# Altium footprint library HARTING THD.PcbLib: 113 footprints (part 5 of 11)
Each footprint in its own frame and in the unit in brackets; x right, y up, seen from the top. Pads: shape width x height; smd on the part's side, far side on the other; paste and mask are expansions set on the pad; w line width, h text height; cw(c..) or ccw(c..) is an arc to the next point about the centre after c.
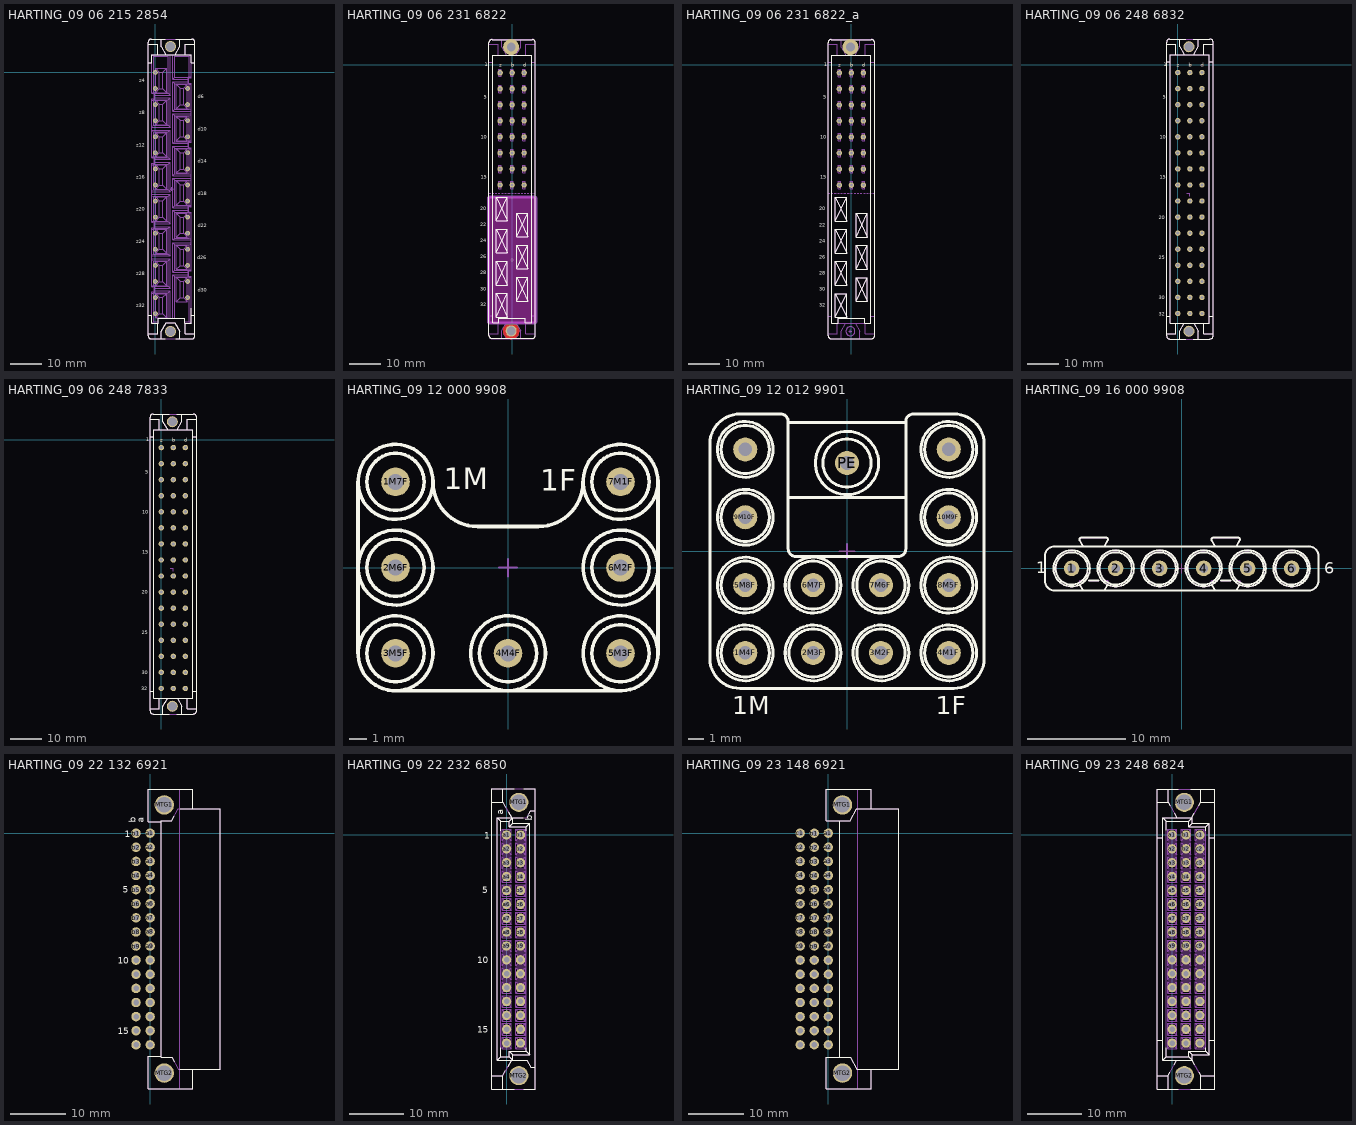
[diagram p4: the footprints below, top view; thin cyan lines are the x and y axes]

## HARTING_09 06 215 2854 [mm] "DIN 41612, Type H, 15 Poles, 2Pins/Pole, Rows z+d, Performance level 1, Low Profile Straight Female Connector, Lead 4.0 mm, Pitch 5.08mm, Pressfit"
height 10.1
pads (32):
  round 1.5 hole 1: d5(10.16,-5.08) d7(10.16,-10.16) d9(10.16,-15.24) d11(10.16,-20.32) d13(10.16,-25.4) d15(10.16,-30.48) d17(10.16,-35.56) d19(10.16,-40.64) d21(10.16,-45.72) d23(10.16,-50.8) d25(10.16,-55.88) d27(10.16,-60.96) d29(10.16,-66.04) d31(10.16,-71.12) z3(0,0) z5(0,-5.08) z7(0,-10.16) z9(0,-15.24) z11(0,-20.32) z13(0,-25.4) z15(0,-30.48) z17(0,-35.56) z19(0,-40.64) z21(0,-45.72) z23(0,-50.8) z25(0,-55.88) z27(0,-60.96) z29(0,-66.04) z31(0,-71.12) z33(0,-76.2)
  round 3.5 / inner round 3.5 / far side round 5.1 hole 2.8: MTG1(4.78,8.17) MTG2(4.78,-81.83)
Top Overlay:
  lines w0.2: 0.705,-79.24 0.705,-82.58 -2.27,-82.58 ; 0.705,5.58 0.705,8.92 -2.27,8.92 ; 3.175,-84.205 1.805,-84.205 ; 3.175,10.545 1.805,10.545 ; 3.3,5.58 1.805,8.17 1.805,10.545 ; 6.26,5.58 7.755,8.17 7.755,10.545 ; 6.385,-84.205 7.755,-84.205 ; 6.385,10.545 7.755,10.545 ; 9.455,-79.24 9.455,-82.58 12.43,-82.58 ; 9.455,5.58 9.455,8.92 12.43,8.92 ; 11.265,-76.78 12.43,-76.78 ; 11.265,-74.54 11.265,-79.24 9.305,-79.24 9.305,-78.69 9.305,-77.67 0.855,-77.67 0.855,-78.69 0.855,-79.24 -1.105,-79.24 -1.105,-76.78 -2.27,-76.78 ; -2.27,-82.58 -2.27,-83.205 ccw(c-1.27,-83.205) -1.27,-84.205 1.805,-84.205 ; -2.27,-82.58 -2.27,-76.78 ; -2.27,-76.78 -2.27,3.12 ; -2.27,3.12 -1.105,3.12 -1.105,5.58 11.265,5.58 11.265,3.12 12.43,3.12 ; -2.27,3.12 -2.27,8.92 ; -2.27,8.92 -2.27,9.545 cw(c-1.27,9.545) -1.27,10.545 1.805,10.545 ; 1.805,-84.205 1.805,-81.83 3.378,-79.105 6.182,-79.105 7.755,-81.83 7.755,-84.205 ; 7.755,-84.205 11.43,-84.205 ccw(c11.43,-83.205) 12.43,-83.205 12.43,-82.58 ; 7.755,10.545 11.43,10.545 cw(c11.43,9.545) 12.43,9.545 12.43,8.92 ; 12.43,-82.58 12.43,-76.78 ; 12.43,-76.78 12.43,3.12 ; 12.43,3.12 12.43,8.92
  text "z32" at -6.02,-74.235 h1.2
  text "z28" at -6.02,-64.075 h1.2
  text "z24" at -6.02,-53.915 h1.2
  text "z20" at -6.02,-43.755 h1.2
  text "z16" at -6.02,-33.595 h1.2
  text "z12" at -6.02,-23.435 h1.2
  text "z8" at -5.125,-13.225 h1.2
  text "z4" at -5.125,-3.065 h1.2
  text "d6" at 13.395,-8.187 h1.2
  text "d10" at 13.4,-18.417 h1.2
  text "d14" at 13.4,-28.577 h1.2
  text "d18" at 13.4,-38.737 h1.2
  text "d22" at 13.4,-48.897 h1.2
  text "d26" at 13.275,-59.057 h1.2
  text "d30" at 13.4,-69.217 h1.2
Mechanical 8:
  lines w0.1: -0.5,-76.2 0,-76.2 ; -0.5,-71.12 0,-71.12 ; -0.5,-66.04 0,-66.04 ; -0.5,-60.96 0,-60.96 ; -0.5,-55.88 0,-55.88 ; -0.5,-50.8 0,-50.8 ; -0.5,-45.72 0,-45.72 ; -0.5,-40.64 0,-40.64 ; -0.5,-35.56 0,-35.56 ; -0.5,-30.48 0,-30.48 ; -0.5,-25.4 0,-25.4 ; -0.5,-20.32 0,-20.32 ; -0.5,-15.24 0,-15.24 ; -0.5,-10.16 0,-10.16 ; -0.5,-5.08 0,-5.08 ; -0.5,0 0,0 ; 0,-76.7 0,-76.2 ; 0,-75.7 0,-76.2 ; 0,-71.62 0,-71.12 ; 0,-70.62 0,-71.12 ; 0,-66.54 0,-66.04 ; 0,-65.54 0,-66.04 ; 0,-61.46 0,-60.96 ; 0,-60.46 0,-60.96 ; 0,-56.38 0,-55.88 ; 0,-55.38 0,-55.88 ; 0,-51.3 0,-50.8 ; 0,-50.3 0,-50.8 ; 0,-46.22 0,-45.72 ; 0,-45.22 0,-45.72 ; 0,-41.14 0,-40.64 ; 0,-40.14 0,-40.64 ; 0,-36.06 0,-35.56 ; 0,-35.06 0,-35.56 ; 0,-30.98 0,-30.48 ; 0,-29.98 0,-30.48 ; 0,-25.9 0,-25.4 ; 0,-24.9 0,-25.4 ; 0,-20.82 0,-20.32 ; 0,-19.82 0,-20.32 ; 0,-15.74 0,-15.24 ; 0,-14.74 0,-15.24 ; 0,-10.66 0,-10.16 ; 0,-9.66 0,-10.16 ; 0,-5.58 0,-5.08 ; 0,-4.58 0,-5.08 ; 0,-0.5 0,0 ; 0,0.5 0,0 ; 0.5,-76.2 0,-76.2 ; 0.5,-71.12 0,-71.12 ; 0.5,-66.04 0,-66.04 ; 0.5,-60.96 0,-60.96 ; 0.5,-55.88 0,-55.88 ; 0.5,-50.8 0,-50.8 ; 0.5,-45.72 0,-45.72 ; 0.5,-40.64 0,-40.64 ; 0.5,-35.56 0,-35.56 ; 0.5,-30.48 0,-30.48 ; 0.5,-25.4 0,-25.4 ; 0.5,-20.32 0,-20.32 ; 0.5,-15.24 0,-15.24 ; 0.5,-10.16 0,-10.16 ; 0.5,-5.08 0,-5.08 ; 0.5,0 0,0 ; 4.28,-81.83 4.78,-81.83 ; 4.28,8.17 4.78,8.17 ; 4.78,-82.33 4.78,-81.83 ; 4.78,-81.33 4.78,-81.83 ; 4.78,7.67 4.78,8.17 ; 4.78,8.67 4.78,8.17 ; 5.28,-81.83 4.78,-81.83 ; 5.28,8.17 4.78,8.17 ; 9.66,-71.12 10.16,-71.12 ; 9.66,-66.04 10.16,-66.04 ; 9.66,-60.96 10.16,-60.96 ; 9.66,-55.88 10.16,-55.88 ; 9.66,-50.8 10.16,-50.8 ; 9.66,-45.72 10.16,-45.72 ; 9.66,-40.64 10.16,-40.64 ; 9.66,-35.56 10.16,-35.56 ; 9.66,-30.48 10.16,-30.48 ; 9.66,-25.4 10.16,-25.4 ; 9.66,-20.32 10.16,-20.32 ; 9.66,-15.24 10.16,-15.24 ; 9.66,-10.16 10.16,-10.16 ; 9.66,-5.08 10.16,-5.08 ; 10.16,-71.62 10.16,-71.12 ; 10.16,-70.62 10.16,-71.12 ; 10.16,-66.54 10.16,-66.04 ; 10.16,-65.54 10.16,-66.04 ; 10.16,-61.46 10.16,-60.96 ; 10.16,-60.46 10.16,-60.96 ; 10.16,-56.38 10.16,-55.88 ; 10.16,-55.38 10.16,-55.88 ; 10.16,-51.3 10.16,-50.8 ; 10.16,-50.3 10.16,-50.8 ; 10.16,-46.22 10.16,-45.72 ; 10.16,-45.22 10.16,-45.72 ; 10.16,-41.14 10.16,-40.64 ; 10.16,-40.14 10.16,-40.64 ; 10.16,-36.06 10.16,-35.56 ; 10.16,-35.06 10.16,-35.56 ; 10.16,-30.98 10.16,-30.48 ; 10.16,-29.98 10.16,-30.48 ; 10.16,-25.9 10.16,-25.4 ; 10.16,-24.9 10.16,-25.4 ; 10.16,-20.82 10.16,-20.32 ; 10.16,-19.82 10.16,-20.32 ; 10.16,-15.74 10.16,-15.24 ; 10.16,-14.74 10.16,-15.24 ; 10.16,-10.66 10.16,-10.16 ; 10.16,-9.66 10.16,-10.16 ; 10.16,-5.58 10.16,-5.08 ; 10.16,-4.58 10.16,-5.08 ; 10.66,-71.12 10.16,-71.12 ; 10.66,-66.04 10.16,-66.04 ; 10.66,-60.96 10.16,-60.96 ; 10.66,-55.88 10.16,-55.88 ; 10.66,-50.8 10.16,-50.8 ; 10.66,-45.72 10.16,-45.72 ; 10.66,-40.64 10.16,-40.64 ; 10.66,-35.56 10.16,-35.56 ; 10.66,-30.48 10.16,-30.48 ; 10.66,-25.4 10.16,-25.4 ; 10.66,-20.32 10.16,-20.32 ; 10.66,-15.24 10.16,-15.24 ; 10.66,-10.16 10.16,-10.16 ; 10.66,-5.08 10.16,-5.08 ; 5.08,-36.83 5.08,-36.33 5.08,-36.83 ; 5.08,-36.83 5.58,-36.83 5.08,-36.83 ; 5.08,-36.83 5.08,-37.33 5.08,-36.83 ; 5.08,-36.83 4.58,-36.83 5.08,-36.83
Mechanical 14:
  drawing of 585 lines, arcs and shapes, not listed
  text "z4" at -5.125,-3.065 h1.2
  text "z8" at -5.125,-13.225 h1.2
  text "z12" at -6.02,-23.435 h1.2
  text "z16" at -6.02,-33.595 h1.2
  text "z20" at -6.02,-43.755 h1.2
  text "z24" at -6.02,-53.915 h1.2
  text "z28" at -6.02,-64.075 h1.2
  text "z32" at -6.02,-74.235 h1.2
  text "z4" at -5.125,-3.065 h1.2
  text "z8" at -5.125,-13.225 h1.2
  text "z12" at -6.02,-23.435 h1.2
  text "z16" at -6.02,-33.595 h1.2
  text "z20" at -6.02,-43.755 h1.2
  text "z24" at -6.02,-53.915 h1.2
  text "z28" at -6.02,-64.075 h1.2
  text "z32" at -6.02,-74.235 h1.2
  text "z32" at -6.02,-74.235 h1.2
  text "z28" at -6.02,-64.075 h1.2
  text "z24" at -6.02,-53.915 h1.2
  text "z20" at -6.02,-43.755 h1.2
  text "z16" at -6.02,-33.595 h1.2
  text "z12" at -6.02,-23.435 h1.2
  text "z8" at -5.125,-13.225 h1.2
  text "z4" at -5.125,-3.065 h1.2
  text "d6" at 13.395,-8.187 h1.2
  text "d10" at 13.4,-18.417 h1.2
  text "d14" at 13.4,-28.577 h1.2
  text "d18" at 13.4,-38.737 h1.2
  text "d22" at 13.4,-48.897 h1.2
  text "d26" at 13.275,-59.057 h1.2
  text "d30" at 13.4,-69.217 h1.2
  text "d30" at 13.4,-69.217 h1.2
  text "d26" at 13.275,-59.057 h1.2
  text "d22" at 13.4,-48.897 h1.2
  text "d18" at 13.4,-38.737 h1.2
  text "d14" at 13.4,-28.577 h1.2
  text "d10" at 13.4,-18.417 h1.2
  text "d6" at 13.395,-8.187 h1.2
  text "d30" at 13.4,-69.217 h1.2
  text "d26" at 13.275,-59.057 h1.2
  text "d22" at 13.4,-48.897 h1.2
  text "d18" at 13.4,-38.737 h1.2
  text "d14" at 13.4,-28.577 h1.2
  text "d10" at 13.4,-18.417 h1.2
  text "d6" at 13.395,-8.187 h1.2
Drill Drawing:
  lines w0.1: -2.5,-55.38 -2.5,-78.24 12.74,-78.24 12.74,5.58 -2.5,5.58 -2.5,-17.28
  text "PRESS-FIT TECHNOLOGY diam. 1mm +0.1 -0" at -2.4,-52.54 h1
3D body "HARTING_09 06 215 2854.stp": height 10.1, standoff -3.6, extent -2.27,-84.205 12.43,10.545

## HARTING_09 06 231 6822 [mm] "DIN 41612, Type MH, 24+ 7 Contacts, Rows z+b+d, Performance level 2, Straight Female Connector"
height 20.53
pads (26):
  round 1.7 hole 1: b2(0,-2.54) b4(0,-7.62) b6(0,-12.7) b8(0,-17.78) b10(0,-22.86) b12(0,-27.94) b14(0,-33.02) b16(0,-38.1) d2(3.81,-2.54) d4(3.81,-7.62) d6(3.81,-12.7) d8(3.81,-17.78) d10(3.81,-22.86) d12(3.81,-27.94) d14(3.81,-33.02) d16(3.81,-38.1) z2(-3.81,-2.54) z4(-3.81,-7.62) z6(-3.81,-12.7) z8(-3.81,-17.78) z10(-3.81,-22.86) z12(-3.81,-27.94) z14(-3.81,-33.02) z16(-3.81,-38.1)
  round 5.1 hole 2.8: MTG1(-0.3,5.63)
  round 3.5 hole 2.8: MTG2(-0.3,-84.37)
Top Layer:
  region: -1.882,-82.37 -2.059,-82.51 -2.358,-82.848 -2.594,-83.233 -2.758,-83.654 -2.845,-84.097 -2.854,-84.548 -2.783,-84.994 -2.634,-85.421 -2.414,-85.814 -2.127,-86.163 -1.783,-86.456 -1.394,-86.685 -0.97,-86.841 -0.526,-86.92 -0.074,-86.92 0.37,-86.841 0.794,-86.685 1.183,-86.456 1.527,-86.163 1.814,-85.814 2.034,-85.421 2.183,-84.994 2.254,-84.548 2.245,-84.097 2.158,-83.654 1.994,-83.233 1.758,-82.848 1.459,-82.51 1.282,-82.37
Bottom Layer:
  region: -1.882,-82.37 -2.059,-82.51 -2.358,-82.848 -2.594,-83.233 -2.758,-83.654 -2.845,-84.097 -2.854,-84.548 -2.783,-84.994 -2.634,-85.421 -2.414,-85.814 -2.127,-86.163 -1.783,-86.456 -1.394,-86.685 -0.97,-86.841 -0.526,-86.92 -0.074,-86.92 0.37,-86.841 0.794,-86.685 1.183,-86.456 1.527,-86.163 1.814,-85.814 2.034,-85.421 2.183,-84.994 2.254,-84.548 2.245,-84.097 2.158,-83.654 1.994,-83.233 1.758,-82.848 1.459,-82.51 1.282,-82.37
Top Overlay:
  lines w0.2: -5.025,-79.965 -1.475,-79.965 ; -5.025,-79.965 -5.025,-72.435 ; -5.025,-79.965 -1.475,-72.435 ; -5.025,-72.435 -1.475,-72.435 ; -5.025,-72.435 -1.475,-79.965 ; -5.025,-69.805 -1.475,-69.805 ; -5.025,-69.805 -5.025,-62.275 ; -5.025,-69.805 -1.475,-62.275 ; -5.025,-62.275 -1.475,-62.275 ; -5.025,-62.275 -1.475,-69.805 ; -5.025,-59.645 -1.475,-59.645 ; -5.025,-59.645 -5.025,-52.115 ; -5.025,-59.645 -1.475,-52.115 ; -5.025,-52.115 -1.475,-52.115 ; -5.025,-52.115 -1.475,-59.645 ; -5.025,-49.485 -1.475,-49.485 ; -5.025,-49.485 -5.025,-41.955 ; -5.025,-49.485 -1.475,-41.955 ; -5.025,-41.955 -1.475,-41.955 ; -5.025,-41.955 -1.475,-49.485 ; -1.475,-79.965 -1.475,-72.435 ; -1.475,-69.805 -1.475,-62.275 ; -1.475,-59.645 -1.475,-52.115 ; -1.475,-49.485 -1.475,-41.955 ; 1.475,-74.885 1.475,-67.355 ; 1.475,-74.885 5.025,-67.355 ; 1.475,-74.885 5.025,-74.885 ; 1.475,-67.355 5.025,-74.885 ; 1.475,-67.355 5.025,-67.355 ; 1.475,-64.725 5.025,-64.725 ; 1.475,-64.725 1.475,-57.195 ; 1.475,-64.725 5.025,-57.195 ; 1.475,-57.195 5.025,-57.195 ; 1.475,-57.195 5.025,-64.725 ; 1.475,-54.565 5.025,-54.565 ; 1.475,-54.565 1.475,-47.035 ; 1.475,-54.565 5.025,-47.035 ; 1.475,-47.035 5.025,-47.035 ; 1.475,-47.035 5.025,-54.565 ; 5.025,-74.885 5.025,-67.355 ; 5.025,-64.725 5.025,-57.195 ; 5.025,-54.565 5.025,-47.035 ; -7.35,-85.745 ccw(c-6.35,-85.745) -6.35,-86.745 6.35,-86.745 ccw(c6.35,-85.745) 7.35,-85.745 7.35,7.005 ccw(c6.35,7.005) 6.35,8.005 -6.35,8.005 ccw(c-6.35,7.005) -7.35,7.005 -7.35,-85.745 ; -6.185,-81.795 -6.185,3.055 6.185,3.055 6.185,-81.795 4.165,-81.795 4.165,-80.265 -4.165,-80.265 -4.165,-81.795 -6.185,-81.795
  text "1" at -8.625,-0.525 h1.2
  text "20" at -10.1,-46.125 h1.2
  text "15" at -9.885,-36.12 h1.2
  text "10" at -9.885,-23.42 h1.2
  text "5" at -8.925,-10.725 h1.2
  text "b" at -0.318,-0.635 h1.2
  text "z" at -4.127,-0.635 h1.2
  text "d" at 3.492,-0.635 h1.2
  text "24" at -10.1,-56.285 h1.2
  text "28" at -10.1,-66.445 h1.2
  text "32" at -10.1,-76.605 h1.2
  text "22" at -10.109,-51.24 h1.2
  text "26" at -10.109,-61.4 h1.2
  text "30" at -10.109,-71.56 h1.2
Keep-Out Layer:
  board cut-out: -7.5,-81.27 -7.5,-81.389 -7.409,-81.61 -7.24,-81.779 -7.019,-81.87 -6.9,-81.87 6.9,-81.87 7.019,-81.87 7.24,-81.779 7.409,-81.61 7.5,-81.389 7.5,-81.27 7.5,-42.47 7.5,-42.351 7.409,-42.13 7.24,-41.961 7.019,-41.87 6.9,-41.87 -6.9,-41.87 -7.019,-41.87 -7.24,-41.961 -7.409,-42.13 -7.5,-42.351 -7.5,-42.47
Mechanical 1:
  lines w1: -7.5,-81.27 ccw(c-6.9,-81.27) -6.9,-81.87 6.9,-81.87 ccw(c6.9,-81.27) 7.5,-81.27 7.5,-42.47 ccw(c6.9,-42.47) 6.9,-41.87 -6.9,-41.87 ccw(c-6.9,-42.47) -7.5,-42.47 -7.5,-81.27
Mechanical 8:
  drawing of 237 lines, arcs and shapes, not listed
Mechanical 14:
  drawing of 190 lines, arcs and shapes, not listed
  text "1" at -8.625,-0.525 h1.2
  text "20" at -10.1,-46.125 h1.2
  text "15" at -9.885,-36.12 h1.2
  text "10" at -9.885,-23.42 h1.2
  text "5" at -8.925,-10.725 h1.2
  text "24" at -10.1,-56.285 h1.2
  text "28" at -10.1,-66.445 h1.2
  text "32" at -10.1,-76.605 h1.2
  text "22" at -10.109,-51.24 h1.2
  text "26" at -10.109,-61.4 h1.2
  text "30" at -10.109,-71.56 h1.2
  text "d" at 3.492,-0.635 h1.2
  text "z" at -4.127,-0.635 h1.2
  text "b" at -0.318,-0.635 h1.2
Drill Drawing:
  lines w0.1: -6.9,-52.088 -7.5,-51.87 ; -6.9,-51.652 -7.5,-51.87 ; -5.218,-81.27 -5,-81.87 ; -5.218,-42.47 -5,-41.87 ; -4.782,-81.27 -5,-81.87 ; -4.782,-42.47 -5,-41.87 ; 3.02,-80.943 6.573,-80.943 7.324,-81.694 ; 6.418,-81.272 7.324,-81.694 ; 6.9,-52.088 7.5,-51.87 ; 6.9,-51.652 7.5,-51.87 ; 6.902,-80.788 7.324,-81.694 ; -7.5,-51.87 7.5,-51.87 ; -5,-81.87 -5,-41.87 ; -7.512,-81.27 ccw(c-6.912,-81.27) -6.912,-81.87 6.888,-81.87 ccw(c6.888,-81.27) 7.488,-81.27 7.488,-42.47 ccw(c6.888,-42.47) 6.888,-41.87 -6.912,-41.87 ccw(c-6.912,-42.47) -7.512,-42.47 -7.512,-81.27
  text "r0.6" at 2.8,-80.7 h1
  text "40" at -5.275,-57.732 h1
  text "15" at -0.592,-51.595 h1
3D body "HARTING_09 06 231 6822.stp": height 19.94, standoff -10.98, extent -7.35,-86.745 7.35,8.005

## HARTING_09 06 231 6822_a [mm] "DIN 41612, Type MH, 24+ 7 Contacts, Rows z+b+d, Performance level 2, Straight Female Connector"
height 20.53
pads (25):
  round 1.7 hole 1: b2(0,-2.54) b4(0,-7.62) b6(0,-12.7) b8(0,-17.78) b10(0,-22.86) b12(0,-27.94) b14(0,-33.02) b16(0,-38.1) d2(3.81,-2.54) d4(3.81,-7.62) d6(3.81,-12.7) d8(3.81,-17.78) d10(3.81,-22.86) d12(3.81,-27.94) d14(3.81,-33.02) d16(3.81,-38.1) z2(-3.81,-2.54) z4(-3.81,-7.62) z6(-3.81,-12.7) z8(-3.81,-17.78) z10(-3.81,-22.86) z12(-3.81,-27.94) z14(-3.81,-33.02) z16(-3.81,-38.1)
  round 5.1 hole 2.8: MTG1(-0.3,5.63)
Top Overlay:
  lines w0.2: -5.025,-79.965 -1.475,-72.435 ; -5.025,-79.965 -5.025,-72.435 ; -5.025,-79.965 -1.475,-79.965 ; -5.025,-72.435 -1.475,-79.965 ; -5.025,-72.435 -1.475,-72.435 ; -5.025,-69.805 -1.475,-62.275 ; -5.025,-69.805 -5.025,-62.275 ; -5.025,-69.805 -1.475,-69.805 ; -5.025,-62.275 -1.475,-69.805 ; -5.025,-62.275 -1.475,-62.275 ; -5.025,-59.645 -1.475,-52.115 ; -5.025,-59.645 -5.025,-52.115 ; -5.025,-59.645 -1.475,-59.645 ; -5.025,-52.115 -1.475,-59.645 ; -5.025,-52.115 -1.475,-52.115 ; -5.025,-49.485 -1.475,-41.955 ; -5.025,-49.485 -5.025,-41.955 ; -5.025,-49.485 -1.475,-49.485 ; -5.025,-41.955 -1.475,-49.485 ; -5.025,-41.955 -1.475,-41.955 ; -1.475,-79.965 -1.475,-72.435 ; -1.475,-69.805 -1.475,-62.275 ; -1.475,-59.645 -1.475,-52.115 ; -1.475,-49.485 -1.475,-41.955 ; 1.475,-74.885 5.025,-74.885 ; 1.475,-74.885 5.025,-67.355 ; 1.475,-74.885 1.475,-67.355 ; 1.475,-67.355 5.025,-67.355 ; 1.475,-67.355 5.025,-74.885 ; 1.475,-64.725 5.025,-57.195 ; 1.475,-64.725 1.475,-57.195 ; 1.475,-64.725 5.025,-64.725 ; 1.475,-57.195 5.025,-64.725 ; 1.475,-57.195 5.025,-57.195 ; 1.475,-54.565 5.025,-47.035 ; 1.475,-54.565 1.475,-47.035 ; 1.475,-54.565 5.025,-54.565 ; 1.475,-47.035 5.025,-54.565 ; 1.475,-47.035 5.025,-47.035 ; 5.025,-74.885 5.025,-67.355 ; 5.025,-64.725 5.025,-57.195 ; 5.025,-54.565 5.025,-47.035 ; -7.35,-85.745 ccw(c-6.35,-85.745) -6.35,-86.745 6.35,-86.745 ccw(c6.35,-85.745) 7.35,-85.745 7.35,7.005 ccw(c6.35,7.005) 6.35,8.005 -6.35,8.005 ccw(c-6.35,7.005) -7.35,7.005 -7.35,-85.745 ; -6.185,-81.795 -4.165,-81.795 -4.165,-80.265 4.165,-80.265 4.165,-81.795 6.185,-81.795 6.185,3.055 -6.185,3.055 -6.185,-81.795
  text "30" at -10.109,-71.56 h1.2
  text "26" at -10.109,-61.4 h1.2
  text "22" at -10.109,-51.24 h1.2
  text "32" at -10.1,-76.605 h1.2
  text "28" at -10.1,-66.445 h1.2
  text "24" at -10.1,-56.285 h1.2
  text "d" at 3.492,-0.635 h1.2
  text "z" at -4.127,-0.635 h1.2
  text "b" at -0.318,-0.635 h1.2
  text "5" at -8.925,-10.725 h1.2
  text "10" at -9.885,-23.42 h1.2
  text "15" at -9.885,-36.12 h1.2
  text "20" at -10.1,-46.125 h1.2
  text "1" at -8.625,-0.525 h1.2
Mechanical 8:
  lines w0.1: -7.35,-40.64 -6.85,-40.64 ; -6.35,-40.64 -5.85,-40.64 ; -5.35,-40.64 -4.85,-40.64 ; -4.35,-40.64 -3.85,-40.64 ; -4.31,-38.1 -3.81,-38.1 ; -4.31,-33.02 -3.81,-33.02 ; -4.31,-27.94 -3.81,-27.94 ; -4.31,-22.86 -3.81,-22.86 ; -4.31,-17.78 -3.81,-17.78 ; -4.31,-12.7 -3.81,-12.7 ; -4.31,-7.62 -3.81,-7.62 ; -3.81,-38.6 -3.81,-38.1 ; -3.81,-37.6 -3.81,-38.1 ; -3.81,-33.52 -3.81,-33.02 ; -3.81,-32.52 -3.81,-33.02 ; -3.81,-28.44 -3.81,-27.94 ; -3.81,-27.44 -3.81,-27.94 ; -3.81,-23.36 -3.81,-22.86 ; -3.81,-22.36 -3.81,-22.86 ; -3.81,-18.28 -3.81,-17.78 ; -3.81,-17.28 -3.81,-17.78 ; -3.81,-13.2 -3.81,-12.7 ; -3.81,-12.2 -3.81,-12.7 ; -3.81,-8.12 -3.81,-7.62 ; -3.81,-7.12 -3.81,-7.62 ; -3.35,-40.64 -2.85,-40.64 ; -3.31,-38.1 -3.81,-38.1 ; -3.31,-33.02 -3.81,-33.02 ; -3.31,-27.94 -3.81,-27.94 ; -3.31,-22.86 -3.81,-22.86 ; -3.31,-17.78 -3.81,-17.78 ; -3.31,-12.7 -3.81,-12.7 ; -3.31,-7.62 -3.81,-7.62 ; -2.35,-40.64 -1.85,-40.64 ; -1.35,-40.64 -0.65,-40.64 ; -0.8,-84.37 -0.3,-84.37 ; -0.8,5.63 -0.3,5.63 ; -0.5,-38.1 0,-38.1 ; -0.5,-33.02 0,-33.02 ; -0.5,-27.94 0,-27.94 ; -0.5,-22.86 0,-22.86 ; -0.5,-17.78 0,-17.78 ; -0.5,-12.7 0,-12.7 ; -0.5,-7.62 0,-7.62 ; -0.5,-2.54 0,-2.54 ; -0.3,-84.87 -0.3,-84.37 ; -0.3,-83.87 -0.3,-84.37 ; -0.3,5.13 -0.3,5.63 ; -0.3,6.13 -0.3,5.63 ; -0.15,-40.64 0.35,-40.64 ; 0,-38.6 0,-38.1 ; 0,-37.6 0,-38.1 ; 0,-33.52 0,-33.02 ; 0,-32.52 0,-33.02 ; 0,-28.44 0,-27.94 ; 0,-27.44 0,-27.94 ; 0,-23.36 0,-22.86 ; 0,-22.36 0,-22.86 ; 0,-18.28 0,-17.78 ; 0,-17.28 0,-17.78 ; 0,-13.2 0,-12.7 ; 0,-12.2 0,-12.7 ; 0,-8.12 0,-7.62 ; 0,-7.12 0,-7.62 ; 0,-3.04 0,-2.54 ; 0,-2.04 0,-2.54 ; 0.2,-84.37 -0.3,-84.37 ; 0.2,5.63 -0.3,5.63 ; 0.5,-38.1 0,-38.1 ; 0.5,-33.02 0,-33.02 ; 0.5,-27.94 0,-27.94 ; 0.5,-22.86 0,-22.86 ; 0.5,-17.78 0,-17.78 ; 0.5,-12.7 0,-12.7 ; 0.5,-7.62 0,-7.62 ; 0.5,-2.54 0,-2.54 ; 0.85,-40.64 1.35,-40.64 ; 1.85,-40.64 2.35,-40.64 ; 2.85,-40.64 3.35,-40.64 ; 3.31,-38.1 3.81,-38.1 ; 3.31,-33.02 3.81,-33.02 ; 3.31,-27.94 3.81,-27.94 ; 3.31,-22.86 3.81,-22.86 ; 3.31,-17.78 3.81,-17.78 ; 3.31,-12.7 3.81,-12.7 ; 3.31,-7.62 3.81,-7.62 ; 3.31,-2.54 3.81,-2.54 ; 3.81,-38.6 3.81,-38.1 ; 3.81,-37.6 3.81,-38.1 ; 3.81,-33.52 3.81,-33.02 ; 3.81,-32.52 3.81,-33.02 ; 3.81,-28.44 3.81,-27.94 ; 3.81,-27.44 3.81,-27.94 ; 3.81,-23.36 3.81,-22.86 ; 3.81,-22.36 3.81,-22.86 ; 3.81,-18.28 3.81,-17.78 ; 3.81,-17.28 3.81,-17.78 ; 3.81,-13.2 3.81,-12.7 ; 3.81,-12.2 3.81,-12.7 ; 3.81,-8.12 3.81,-7.62 ; 3.81,-7.12 3.81,-7.62 ; 3.81,-3.04 3.81,-2.54 ; 3.81,-2.04 3.81,-2.54 ; 3.85,-40.64 4.35,-40.64 ; 4.31,-38.1 3.81,-38.1 ; 4.31,-33.02 3.81,-33.02 ; 4.31,-27.94 3.81,-27.94 ; 4.31,-22.86 3.81,-22.86 ; 4.31,-17.78 3.81,-17.78 ; 4.31,-12.7 3.81,-12.7 ; 4.31,-7.62 3.81,-7.62 ; 4.31,-2.54 3.81,-2.54 ; 4.85,-40.64 5.35,-40.64 ; 5.85,-40.64 6.35,-40.64 ; 6.85,-40.64 7.35,-40.64 ; -3.81,-2.54 -4.31,-2.54 -3.81,-2.54 ; -3.81,-2.54 -3.81,-2.04 -3.81,-2.54 ; -3.81,-2.54 -3.31,-2.54 -3.81,-2.54 ; -3.81,-2.54 -3.81,-3.04 -3.81,-2.54
Mechanical 14:
  drawing of 190 lines, arcs and shapes, not listed
  text "b" at -0.318,-0.635 h1.2
  text "z" at -4.127,-0.635 h1.2
  text "d" at 3.492,-0.635 h1.2
  text "30" at -10.109,-71.56 h1.2
  text "26" at -10.109,-61.4 h1.2
  text "22" at -10.109,-51.24 h1.2
  text "32" at -10.1,-76.605 h1.2
  text "28" at -10.1,-66.445 h1.2
  text "24" at -10.1,-56.285 h1.2
  text "5" at -8.925,-10.725 h1.2
  text "10" at -9.885,-23.42 h1.2
  text "15" at -9.885,-36.12 h1.2
  text "20" at -10.1,-46.125 h1.2
  text "1" at -8.625,-0.525 h1.2
3D body "HARTING_09 06 231 6822.stp": height 19.94, standoff -10.98, extent -7.35,-86.745 7.35,8.005

## HARTING_09 06 248 6832 [mm] "DIN 41612, Type F,  Thru-Hole Press-in Terminations;Rows z+b+d, 48 Contacts, Straight Female Connector, Performance level 2, Lead 5.6mm"
height 10.1
pads (50):
  round 1.7 hole 1: b2(3.81,-2.54) b4(3.81,-7.62) b6(3.81,-12.7) b8(3.81,-17.78) b10(3.81,-22.86) b12(3.81,-27.94) b14(3.81,-33.02) b16(3.81,-38.1) b18(3.81,-43.18) b20(3.81,-48.26) b22(3.81,-53.34) b24(3.81,-58.42) b26(3.81,-63.5) b28(3.81,-68.58) b30(3.81,-73.66) b32(3.81,-78.74) d2(7.62,-2.54) d4(7.62,-7.62) d6(7.62,-12.7) d8(7.62,-17.78) d10(7.62,-22.86) d12(7.62,-27.94) d14(7.62,-33.02) d16(7.62,-38.1) d18(7.62,-43.18) d20(7.62,-48.26) d22(7.62,-53.34) d24(7.62,-58.42) d26(7.62,-63.5) d28(7.62,-68.58) d30(7.62,-73.66) d32(7.62,-78.74) z2(0,-2.54) z4(0,-7.62) z6(0,-12.7) z8(0,-17.78) z10(0,-22.86) z12(0,-27.94) z14(0,-33.02) z16(0,-38.1) z18(0,-43.18) z20(0,-48.26) z22(0,-53.34) z24(0,-58.42) z26(0,-63.5) z28(0,-68.58) z30(0,-73.66) z32(0,-78.74)
  round 3.5 / inner round 3.5 / far side round 5.1 hole 2.8: MTG1(3.51,5.63) MTG2(3.51,-84.37)
Top Overlay:
  lines w0.2: -3.54,-85.22 -0.58,-85.22 -0.58,-81.845 ; -3.54,-79.57 -2.365,-79.57 ; -3.54,0.83 -2.365,0.83 ; -3.54,6.48 -0.58,6.48 -0.58,3.105 ; 0.535,-86.82 0.535,-84.37 1.993,-81.845 ; 0.535,8.08 0.535,5.63 1.993,3.105 ; 2.492,-86.82 -2.54,-86.82 cw(c-2.54,-85.82) -3.54,-85.82 -3.54,7.08 cw(c-2.54,7.08) -2.54,8.08 2.492,8.08 ; 4.874,-86.82 10.16,-86.82 ccw(c10.16,-85.82) 11.16,-85.82 11.16,7.08 ccw(c10.16,7.08) 10.16,8.08 4.874,8.08 ; 5.027,-81.845 6.485,-84.37 6.485,-86.82 ; 5.027,3.105 6.485,5.63 6.485,8.08 ; 8.17,-81.845 8.17,-85.22 11.16,-85.22 ; 8.17,3.105 8.17,6.48 11.16,6.48 ; 9.985,-79.57 11.16,-79.57 ; 9.985,0.83 11.16,0.83 ; -2.365,-81.845 9.985,-81.845 9.985,3.105 -2.365,3.105 -2.365,-81.845
  text "b" at 3.493,-0.635 h1.2
  text "z" at -0.317,-0.635 h1.2
  text "d" at 7.303,-0.635 h1.2
  text "1" at -4.49,-0.6 h1.2
  text "30" at -5.967,-74.295 h1.2
  text "25" at -5.967,-61.595 h1.2
  text "20" at -5.967,-48.895 h1.2
  text "15" at -5.75,-36.195 h1.2
  text "10" at -5.75,-23.495 h1.2
  text "5" at -4.79,-10.8 h1.2
  text "32" at -5.99,-79.4 h1.2
Mechanical 8:
  lines w0.1: 2.81,-40.64 3.81,-40.64 3.81,-41.64
Mechanical 14:
  circle w0.1: c3.51,5.63 r1.4
  circle w0.1: c3.51,-84.37 r1.4
  lines w0.1: -3.54,-85.22 -0.58,-85.22 -0.58,-81.845 ; -3.54,-79.57 -2.365,-79.57 ; -3.54,0.83 -2.365,0.83 ; -3.54,6.48 -0.58,6.48 -0.58,3.105 ; 0.535,-86.82 0.535,-84.37 1.993,-81.845 ; 0.535,8.08 0.535,5.63 1.993,3.105 ; 5.027,-81.845 6.485,-84.37 6.485,-86.82 ; 5.027,3.105 6.485,5.63 6.485,8.08 ; 8.17,-81.845 8.17,-85.22 11.16,-85.22 ; 8.17,3.105 8.17,6.48 11.16,6.48 ; 9.985,-79.57 11.16,-79.57 ; 9.985,0.83 11.16,0.83 ; -3.54,-85.82 ccw(c-2.54,-85.82) -2.54,-86.82 10.16,-86.82 ccw(c10.16,-85.82) 11.16,-85.82 11.16,7.08 ccw(c10.16,7.08) 10.16,8.08 -2.54,8.08 ccw(c-2.54,7.08) -3.54,7.08 -3.54,-85.82 ; -2.365,-81.845 -2.365,3.105 9.985,3.105 9.985,-81.845 -2.365,-81.845